# Altium footprint library LukaLIBRARY.PcbLib: 772 footprints (part 5 of 49)
Each footprint in its own frame and in the unit in brackets; x right, y up, seen from the top. Pads: shape width x height; smd on the part's side, far side on the other; paste and mask are expansions set on the pad; w line width, h text height; cw(c..) or ccw(c..) is an arc to the next point about the centre after c.
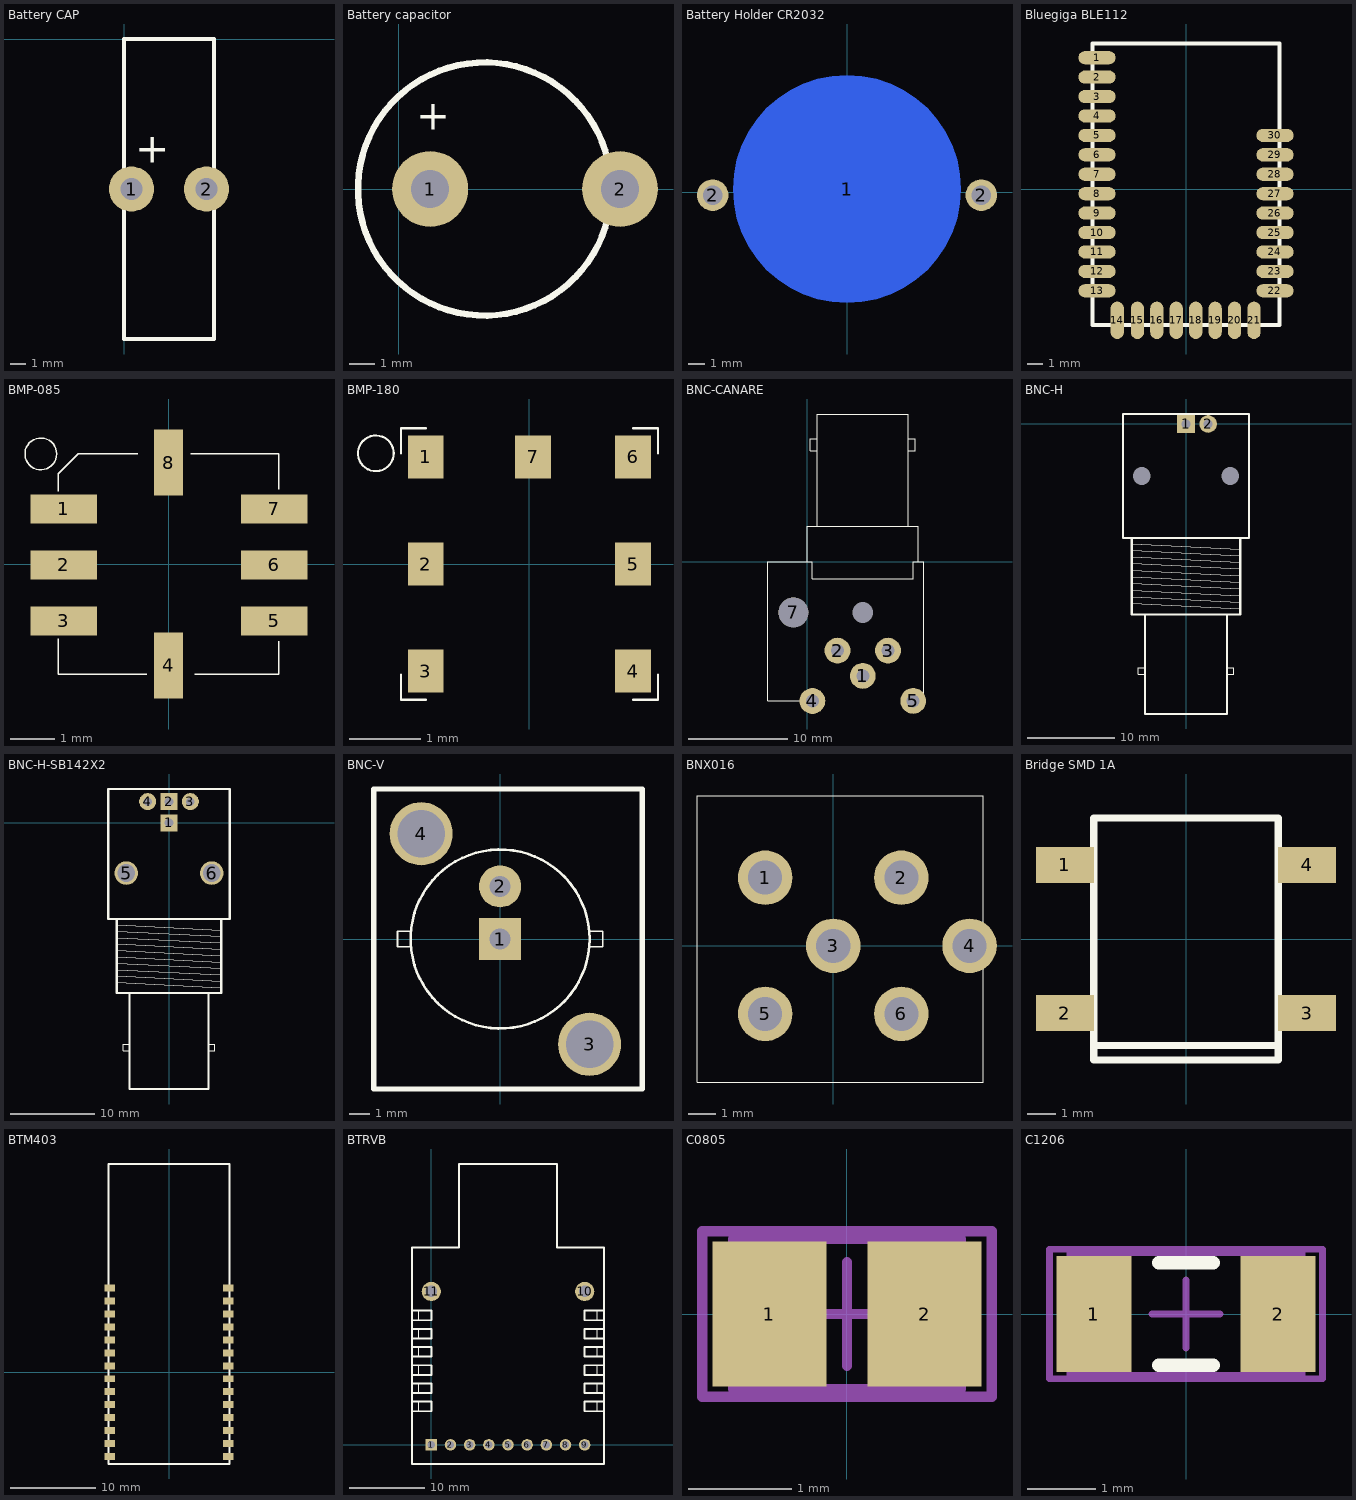
[diagram p4: the footprints below, top view; thin cyan lines are the x and y axes]

## Battery CAP [mm]
pads (2):
  round 3 hole 1.5: 1(0.5,-10) 2(5.5,-10)
Top Overlay:
  lines w0.254: 0,-20 6,-20 6,0 0,0 0,-20
  text "+" at 0.75,-8.25 h2

## Battery capacitor [mm] "Battery cap"
pads (2):
  round 3 hole 1.5: 1(1.25,0) 2(8.75,0)
Top Overlay:
  circle w0.254: c3.4,0 r5
  text "+" at 0.7,1.95 h2

## Battery Holder CR2032 [mil]
pads (3):
  round 551.18 smd far side: 1(0,7.5)
  round 76 hole 48: 2(-324.8,-7.5) 2(324.8,-7.5)

## Bluegiga BLE112 [mm]
pads (30):
  oval 2.4x0.85 smd: 1(-5.725,8.45) 2(-5.725,7.2) 3(-5.725,5.95) 4(-5.725,4.7) 5(-5.725,3.45) 6(-5.725,2.2) 7(-5.725,0.95) 8(-5.725,-0.3) 9(-5.725,-1.55) 10(-5.725,-2.8) 11(-5.725,-4.05) 12(-5.725,-5.3) 13(-5.725,-6.55) 22(5.725,-6.55) 23(5.725,-5.3) 24(5.725,-4.05) 26(5.725,-1.55) 27(5.725,-0.3) 28(5.725,0.95) 30(5.725,3.45)
  oval 0.85x2.4 smd: 14(-4.425,-8.45) 15(-3.125,-8.45) 16(-1.875,-8.45) 18(0.625,-8.45) 19(1.875,-8.45) 20(3.125,-8.45)
  oval 0.86x2.4 smd: 17(-0.625,-8.45) 21(4.375,-8.45)
  oval 2.4x0.86 smd: 25(5.725,-2.8) 29(5.725,2.2)
Top Overlay:
  lines w0.254: -6.025,-8.745 -6.025,9.35 6.025,9.35 6.025,-8.745 -6.025,-8.745

## BMP-085 [mm]
pads (8):
  rect 1.5x0.66 smd mask-25.4: 1(-2.38,1.25) 2(-2.38,-0.02) 3(-2.38,-1.29) 5(2.4,-1.29) 6(2.4,-0.02) 7(2.4,1.25)
  rect 0.66x1.5 smd mask-25.4: 4(0,-2.3) 8(0,2.3)
Top Overlay:
  circle w0.03: c-2.9,2.5 r0.361
  lines w0.03: -2.5,-1.7 -2.5,-2.5 -0.5,-2.5 ; -2.5,1.65 -2.5,2.05 -2.05,2.5 -0.7,2.5 ; 0.5,2.5 2.5,2.5 2.5,1.7 ; 0.6,-2.5 2.5,-2.5 2.5,-1.75
Top Solder:
  region: 1.384,-0.35 3.416,-0.35 3.416,0.31 1.384,0.31
  region: -3.396,-0.35 -1.364,-0.35 -1.364,0.31 -3.396,0.31
  region: 1.384,0.92 3.416,0.92 3.416,1.58 1.384,1.58
  region: 1.384,-1.62 3.416,-1.62 3.416,-0.96 1.384,-0.96
  region: 0.33,1.284 0.33,3.316 -0.33,3.316 -0.33,1.284
  region: -3.396,0.92 -1.364,0.92 -1.364,1.58 -3.396,1.58
  region: 0.33,-3.316 0.33,-1.284 -0.33,-1.284 -0.33,-3.316
  region: -3.396,-1.62 -1.364,-1.62 -1.364,-0.96 -3.396,-0.96

## BMP-180 [mm]
pads (7):
  rect 0.5x0.6 smd mask-25.4: 1(-1.45,1.5) 2(-1.45,0) 3(-1.45,-1.5) 4(1.45,-1.5) 5(1.45,0) 6(1.45,1.5) 7(0.05,1.5)
Top Overlay:
  circle w0.03: c-2.15,1.55 r0.25
  lines w0.03: -1.8,-1.55 -1.8,-1.9 -1.45,-1.9 ; -1.8,1.55 -1.8,1.9 -1.45,1.9 ; 1.45,-1.9 1.8,-1.9 1.8,-1.55 ; 1.45,1.9 1.8,1.9 1.8,1.55
Top Solder:
  region: -1.7,-1.8 -1.2,-1.8 -1.2,-1.2 -1.7,-1.2
  region: 1.7,-1.2 1.2,-1.2 1.2,-1.8 1.7,-1.8
  region: -1.7,1.2 -1.2,1.2 -1.2,1.8 -1.7,1.8
  region: -0.2,1.2 0.3,1.2 0.3,1.8 -0.2,1.8
  region: 1.2,1.2 1.7,1.2 1.7,1.8 1.2,1.8
  region: -1.7,-0.3 -1.2,-0.3 -1.2,0.3 -1.7,0.3
  region: 1.2,-0.3 1.7,-0.3 1.7,0.3 1.2,0.3

## BNC-CANARE [mm]
pads (7):
  round 2.6 hole 1.3 mask-25.4: 1(5.6,-11.5) 2(3.05,-8.95) 3(8.14,-8.95) 4(0.52,-14.03) 5(10.68,-14.02)
  round 0 hole 2.1 mask-25.4: 6(5.6,-5.1)
  round 3 hole 3: 7(-1.4,-5.1)
Top Overlay:
  lines w0.001: 0,0.01 0,3.61 5.6,3.61 11.2,3.61 11.2,0.01 ; 1,3.61 1,14.91 5.59,14.91 10.19,14.91 10.19,3.61 ; 1,11.22 0.29,11.22 0.29,12.43 1,12.43 ; 10.19,11.22 10.9,11.22 10.9,12.43 10.19,12.43 ; 10.7,-1.72 10.7,0
  lines w0.076: -0.51,-14.03 -3.98,-14.03 -3.98,0 0.5,0 0.5,-1.72 10.7,-1.72 ; 10.7,0 11.75,0 11.75,-14.04
Top Solder:
  drawing of 6 lines, arcs and shapes, not listed
Bottom Solder:
  drawing of 6 lines, arcs and shapes, not listed

## BNC-H [mil]
pads (4):
  rect 80x80 hole 40 mask-1000: 1(0,0)
  round 80 hole 40 mask-1000: 2(100,0)
  round 0 hole 80 mask-1000: 3(200,-235) 4(-200,-235)
Top Overlay:
  lines w3: -190,-1130 -215,-1130 -215,-1100 -190,-1100 ; 190,-1130 215,-1130 215,-1100 190,-1100
  lines w5: -245,-810 245,-835 ; -245,-780 245,-805 ; -245,-750 245,-775 ; -245,-720 245,-745 ; -245,-690 245,-715 ; -245,-660 245,-685 ; -245,-630 245,-655 ; -245,-600 245,-625 ; -245,-570 245,-595 ; -245,-540 245,-565
  lines w10: -245,-515 -245,-860 245,-860 245,-515 ; -185,-860 -185,-1310 185,-1310 185,-860 ; -285,-515 285,-515 285,45 -285,45 -285,-515
Top Solder:
  region: -40,-40 40,-40 40,40 -40,40
  region: 100,40.35 89.56,38.97 79.83,34.94 71.47,28.53 65.06,20.17 61.03,10.44 59.65,0 61.03,-10.44 65.06,-20.17 71.47,-28.53 79.83,-34.94 89.56,-38.97 100,-40.35 110.44,-38.97 120.17,-34.94 128.53,-28.53 134.94,-20.17 138.97,-10.44 140.35,0 138.97,10.44 134.94,20.17 128.53,28.53 120.17,34.94 110.44,38.97
  region: 200,-164.98 186.34,-166.32 173.2,-170.31 161.1,-176.78 150.49,-185.49 141.78,-196.1 135.31,-208.2 131.32,-221.34 129.98,-235 131.32,-248.66 135.31,-261.8 141.78,-273.9 150.49,-284.51 161.1,-293.22 173.2,-299.69 186.34,-303.68 200,-305.02 213.66,-303.68 226.8,-299.69 238.9,-293.22 249.51,-284.51 258.22,-273.9 264.69,-261.8 268.68,-248.66 270.02,-235 268.68,-221.34 264.69,-208.2 258.22,-196.1 249.51,-185.49 238.9,-176.78 226.8,-170.31 213.66,-166.32
  region: -200,-164.98 -213.66,-166.32 -226.8,-170.31 -238.9,-176.78 -249.51,-185.49 -258.22,-196.1 -264.69,-208.2 -268.68,-221.34 -270.02,-235 -268.68,-248.66 -264.69,-261.8 -258.22,-273.9 -249.51,-284.51 -238.9,-293.22 -226.8,-299.69 -213.66,-303.68 -200,-305.02 -186.34,-303.68 -173.2,-299.69 -161.1,-293.22 -150.49,-284.51 -141.78,-273.9 -135.31,-261.8 -131.32,-248.66 -129.98,-235 -131.32,-221.34 -135.31,-208.2 -141.78,-196.1 -150.49,-185.49 -161.1,-176.78 -173.2,-170.31 -186.34,-166.32
Bottom Solder:
  region: -40,-40 40,-40 40,40 -40,40
  region: 100,40.35 89.56,38.97 79.83,34.94 71.47,28.53 65.06,20.17 61.03,10.44 59.65,0 61.03,-10.44 65.06,-20.17 71.47,-28.53 79.83,-34.94 89.56,-38.97 100,-40.35 110.44,-38.97 120.17,-34.94 128.53,-28.53 134.94,-20.17 138.97,-10.44 140.35,0 138.97,10.44 134.94,20.17 128.53,28.53 120.17,34.94 110.44,38.97
  region: 200,-164.98 186.34,-166.32 173.2,-170.31 161.1,-176.78 150.49,-185.49 141.78,-196.1 135.31,-208.2 131.32,-221.34 129.98,-235 131.32,-248.66 135.31,-261.8 141.78,-273.9 150.49,-284.51 161.1,-293.22 173.2,-299.69 186.34,-303.68 200,-305.02 213.66,-303.68 226.8,-299.69 238.9,-293.22 249.51,-284.51 258.22,-273.9 264.69,-261.8 268.68,-248.66 270.02,-235 268.68,-221.34 264.69,-208.2 258.22,-196.1 249.51,-185.49 238.9,-176.78 226.8,-170.31 213.66,-166.32
  region: -200,-164.98 -213.66,-166.32 -226.8,-170.31 -238.9,-176.78 -249.51,-185.49 -258.22,-196.1 -264.69,-208.2 -268.68,-221.34 -270.02,-235 -268.68,-248.66 -264.69,-261.8 -258.22,-273.9 -249.51,-284.51 -238.9,-293.22 -226.8,-299.69 -213.66,-303.68 -200,-305.02 -186.34,-303.68 -173.2,-299.69 -161.1,-293.22 -150.49,-284.51 -141.78,-273.9 -135.31,-261.8 -131.32,-248.66 -129.98,-235 -131.32,-221.34 -135.31,-208.2 -141.78,-196.1 -150.49,-185.49 -161.1,-176.78 -173.2,-170.31 -186.34,-166.32

## BNC-H-SB142X2 [mil]
pads (6):
  rect 80x80 hole 40 mask-1000: 1(0,0) 2(0,100)
  round 80 hole 40 mask-1000: 3(100,100) 4(-100,100)
  round 110.24 hole 82.68 mask-1000: 5(-200,-235) 6(200,-235)
Top Overlay:
  lines w3: -190,-1067 -215,-1067 -215,-1037 -190,-1037 ; 190,-1067 215,-1067 215,-1037 190,-1037
  lines w5: -245,-747 245,-772 ; -245,-717 245,-742 ; -245,-687 245,-712 ; -245,-657 245,-682 ; -245,-627 245,-652 ; -245,-597 245,-622 ; -245,-567 245,-592 ; -245,-537 245,-562 ; -245,-507 245,-532 ; -245,-477 245,-502
  lines w10: -285,159 -285,-451 285,-451 285,159 -284,159 ; -245,-452 -245,-797 245,-797 245,-452 ; -185,-797 -185,-1247 185,-1247 185,-797
Top Solder:
  region: -40,60 40,60 40,140 -40,140
  region: -40,-40 40,-40 40,40 -40,40
  region: 200,-179.41 185.61,-181.3 172.2,-186.85 160.69,-195.69 151.85,-207.2 146.3,-220.61 144.41,-235 146.3,-249.39 151.85,-262.8 160.69,-274.31 172.2,-283.15 185.61,-288.7 200,-290.59 214.39,-288.7 227.8,-283.15 239.31,-274.31 248.15,-262.8 253.7,-249.39 255.59,-235 253.7,-220.61 248.15,-207.2 239.31,-195.69 227.8,-186.85 214.39,-181.3
  region: 100,140.35 89.56,138.97 79.83,134.94 71.47,128.53 65.06,120.17 61.03,110.44 59.65,100 61.03,89.56 65.06,79.83 71.47,71.47 79.83,65.06 89.56,61.03 100,59.65 110.44,61.03 120.17,65.06 128.53,71.47 134.94,79.83 138.97,89.56 140.35,100 138.97,110.44 134.94,120.17 128.53,128.53 120.17,134.94 110.44,138.97
  region: -200,-179.41 -214.39,-181.3 -227.8,-186.85 -239.31,-195.69 -248.15,-207.2 -253.7,-220.61 -255.59,-235 -253.7,-249.39 -248.15,-262.8 -239.31,-274.31 -227.8,-283.15 -214.39,-288.7 -200,-290.59 -185.61,-288.7 -172.2,-283.15 -160.69,-274.31 -151.85,-262.8 -146.3,-249.39 -144.41,-235 -146.3,-220.61 -151.85,-207.2 -160.69,-195.69 -172.2,-186.85 -185.61,-181.3
  region: -100,140.35 -110.44,138.97 -120.17,134.94 -128.53,128.53 -134.94,120.17 -138.97,110.44 -140.35,100 -138.97,89.56 -134.94,79.83 -128.53,71.47 -120.17,65.06 -110.44,61.03 -100,59.65 -89.56,61.03 -79.83,65.06 -71.47,71.47 -65.06,79.83 -61.03,89.56 -59.65,100 -61.03,110.44 -65.06,120.17 -71.47,128.53 -79.83,134.94 -89.56,138.97
Bottom Solder:
  region: -40,60 40,60 40,140 -40,140
  region: -40,-40 40,-40 40,40 -40,40
  region: 200,-179.41 185.61,-181.3 172.2,-186.85 160.69,-195.69 151.85,-207.2 146.3,-220.61 144.41,-235 146.3,-249.39 151.85,-262.8 160.69,-274.31 172.2,-283.15 185.61,-288.7 200,-290.59 214.39,-288.7 227.8,-283.15 239.31,-274.31 248.15,-262.8 253.7,-249.39 255.59,-235 253.7,-220.61 248.15,-207.2 239.31,-195.69 227.8,-186.85 214.39,-181.3
  region: 100,140.35 89.56,138.97 79.83,134.94 71.47,128.53 65.06,120.17 61.03,110.44 59.65,100 61.03,89.56 65.06,79.83 71.47,71.47 79.83,65.06 89.56,61.03 100,59.65 110.44,61.03 120.17,65.06 128.53,71.47 134.94,79.83 138.97,89.56 140.35,100 138.97,110.44 134.94,120.17 128.53,128.53 120.17,134.94 110.44,138.97
  region: -200,-179.41 -214.39,-181.3 -227.8,-186.85 -239.31,-195.69 -248.15,-207.2 -253.7,-220.61 -255.59,-235 -253.7,-249.39 -248.15,-262.8 -239.31,-274.31 -227.8,-283.15 -214.39,-288.7 -200,-290.59 -185.61,-288.7 -172.2,-283.15 -160.69,-274.31 -151.85,-262.8 -146.3,-249.39 -144.41,-235 -146.3,-220.61 -151.85,-207.2 -160.69,-195.69 -172.2,-186.85 -185.61,-181.3
  region: -100,140.35 -110.44,138.97 -120.17,134.94 -128.53,128.53 -134.94,120.17 -138.97,110.44 -140.35,100 -138.97,89.56 -134.94,79.83 -128.53,71.47 -120.17,65.06 -110.44,61.03 -100,59.65 -89.56,61.03 -79.83,65.06 -71.47,71.47 -65.06,79.83 -61.03,89.56 -59.65,100 -61.03,110.44 -65.06,120.17 -71.47,128.53 -79.83,134.94 -89.56,138.97

## BNC-V [mil]
pads (4):
  rect 80x80 hole 40 mask-1000: 1(0,0)
  round 80 hole 40 mask-1000: 2(0,100)
  round 120 hole 90: 3(170,-200) 4(-150,200)
Top Overlay:
  circle w5: c0,0 r170
  lines w3: -170,-15 -195,-15 -195,15 -170,15 ; 170,-15 195,-15 195,15 170,15
  lines w10: -240,-285 270,-285 270,285 -240,285 -240,-285
Top Solder:
  region: -40,-40 40,-40 40,40 -40,40
  region: 0,140.35 -10.44,138.97 -20.17,134.94 -28.53,128.53 -34.94,120.17 -38.97,110.44 -40.35,100 -38.97,89.56 -34.94,79.83 -28.53,71.47 -20.17,65.06 -10.44,61.03 0,59.65 10.44,61.03 20.17,65.06 28.53,71.47 34.94,79.83 38.97,89.56 40.35,100 38.97,110.44 34.94,120.17 28.53,128.53 20.17,134.94 10.44,138.97
Bottom Solder:
  region: -40,-40 40,-40 40,40 -40,40
  region: 0,140.35 -10.44,138.97 -20.17,134.94 -28.53,128.53 -34.94,120.17 -38.97,110.44 -40.35,100 -38.97,89.56 -34.94,79.83 -28.53,71.47 -20.17,65.06 -10.44,61.03 0,59.65 10.44,61.03 20.17,65.06 28.53,71.47 34.94,79.83 38.97,89.56 40.35,100 38.97,110.44 34.94,120.17 28.53,128.53 20.17,134.94 10.44,138.97

## BNX016 [mm]
pads (6):
  round 2 hole 1.25 mask-25.4: 1(-2.5,2.5) 2(2.5,2.5) 3(0,0) 4(5,0) 5(-2.5,-2.5) 6(2.5,-2.5)
Top Overlay:
  lines w0.01: -5,-5 5.5,-5 5.5,5.5 -5,5.5 -5,-5
Top Solder:
  drawing of 6 lines, arcs and shapes, not listed
Bottom Solder:
  drawing of 6 lines, arcs and shapes, not listed

## Bridge SMD 1A [mil]
pads (4):
  rect 80x50 smd: 1(-167.5,102.5) 2(-167.5,-102.5) 3(167.5,-102.5) 4(167.5,102.5)
Top Overlay:
  lines w10: -127.5,-147.5 127.5,-147.5 ; -127.5,-167.5 127.5,-167.5 127.5,167.5 -127.5,167.5 -127.5,-167.5

## BTM403 [mil]
pads (28):
  rect 50x32 smd: 1(-275,390) 2(-275,330) 3(-275,270) 4(-275,210) 5(-275,150) 6(-275,90) 7(-275,30) 8(-275,-30) 9(-275,-90) 10(-275,-150) 11(-275,-210) 12(-275,-270) 13(-275,-330) 14(-275,-390) 15(275,-390) 16(275,-330) 17(275,-270) 18(275,-210) 19(275,-150) 20(275,-90) 21(275,-30) 22(275,30) 23(275,90) 24(275,150) 25(275,210) 26(275,270) 27(275,330) 28(275,390)
Top Overlay:
  lines w10: -280,-425 280,-425 280,965 -280,965 -280,-425

## BTRVB [mil]
pads (11):
  rect 60x60 hole 38 mask-1000: 1(0,0)
  round 60 hole 38 mask-1000: 2(100,0) 3(200,0) 4(300,0) 5(400,0) 6(500,0) 7(600,0) 8(700,0) 9(800,0)
  round 100 hole 60: 10(800,800) 11(0,800)
Top Overlay:
  lines w1: -65,175 -65,225 ; -65,270 -65,320 ; -65,365 -65,415 ; -65,460 -65,510 ; -65,555 -65,605 ; -65,650 -65,700 ; 865,175 865,225 ; 865,270 865,320 ; 865,365 865,415 ; 865,460 865,510 ; 865,555 865,605 ; 865,650 865,700
  lines w10: -100,175 0,175 0,225 -100,225 ; -100,270 0,270 0,320 -100,320 ; -100,365 0,365 0,415 -100,415 ; -100,460 0,460 0,510 -100,510 ; -100,555 0,555 0,605 -100,605 ; -100,650 0,650 0,700 -100,700 ; 900,175 800,175 800,225 900,225 ; 900,270 800,270 800,320 900,320 ; 900,365 800,365 800,415 900,415 ; 900,460 800,460 800,510 900,510 ; 900,555 800,555 800,605 900,605 ; 900,650 800,650 800,700 900,700 ; -100,-100 -100,1030 145,1030 145,1465 655,1465 655,1030 900,1030 900,-100 -100,-100
Top Solder:
  drawing of 9 lines, arcs and shapes, not listed
Bottom Solder:
  drawing of 9 lines, arcs and shapes, not listed

## C0805 [mm] "Chip Capacitor, Body 2.0x1.3mm, IPC High Density"
height 1.4
pads (2):
  rect 1.1x1.4 smd: 1(-0.75,0) 2(0.75,0)
Mechanical 13:
  lines w0.1: -1.1,-0.725 1.1,-0.725 1.1,0.725 -1.1,0.725 -1.1,-0.725
Mechanical 15:
  lines w0.1: -0.5,0 0.5,0 ; 0,-0.5 0,0.5 ; -1.4,-0.8 1.4,-0.8 1.4,0.8 -1.4,0.8 -1.4,-0.8
3D body: height 1.4, standoff 0, extent -1.1,-0.725 1.1,0.725

## C1206 [mm] "Chip Capacitor, Body 3.2x1.6mm, IPC High Density"
height 1.3
pads (2):
  rect 1.1x1.7 smd: 1(-1.35,0) 2(1.35,0)
Top Overlay:
  lines w0.2: -0.4,-0.75 0.4,-0.75 ; -0.4,0.75 0.4,0.75
Mechanical 13:
  lines w0.1: -1.7,-0.9 1.7,-0.9 1.7,0.9 -1.7,0.9 -1.7,-0.9
Mechanical 15:
  lines w0.1: -0.5,0 0.5,0 ; 0,-0.5 0,0.5 ; -2,-0.95 2,-0.95 2,0.95 -2,0.95 -2,-0.95
3D body: height 1.3, standoff 0, extent -1.7,-0.9 1.7,0.9